# Altium footprint library Разъемы.PcbLib: 291 footprints (part 2 of 19)
Each footprint in its own frame and in the unit in brackets; x right, y up, seen from the top. Pads: shape width x height; smd on the part's side, far side on the other; paste and mask are expansions set on the pad; w line width, h text height; cw(c..) or ccw(c..) is an arc to the next point about the centre after c.
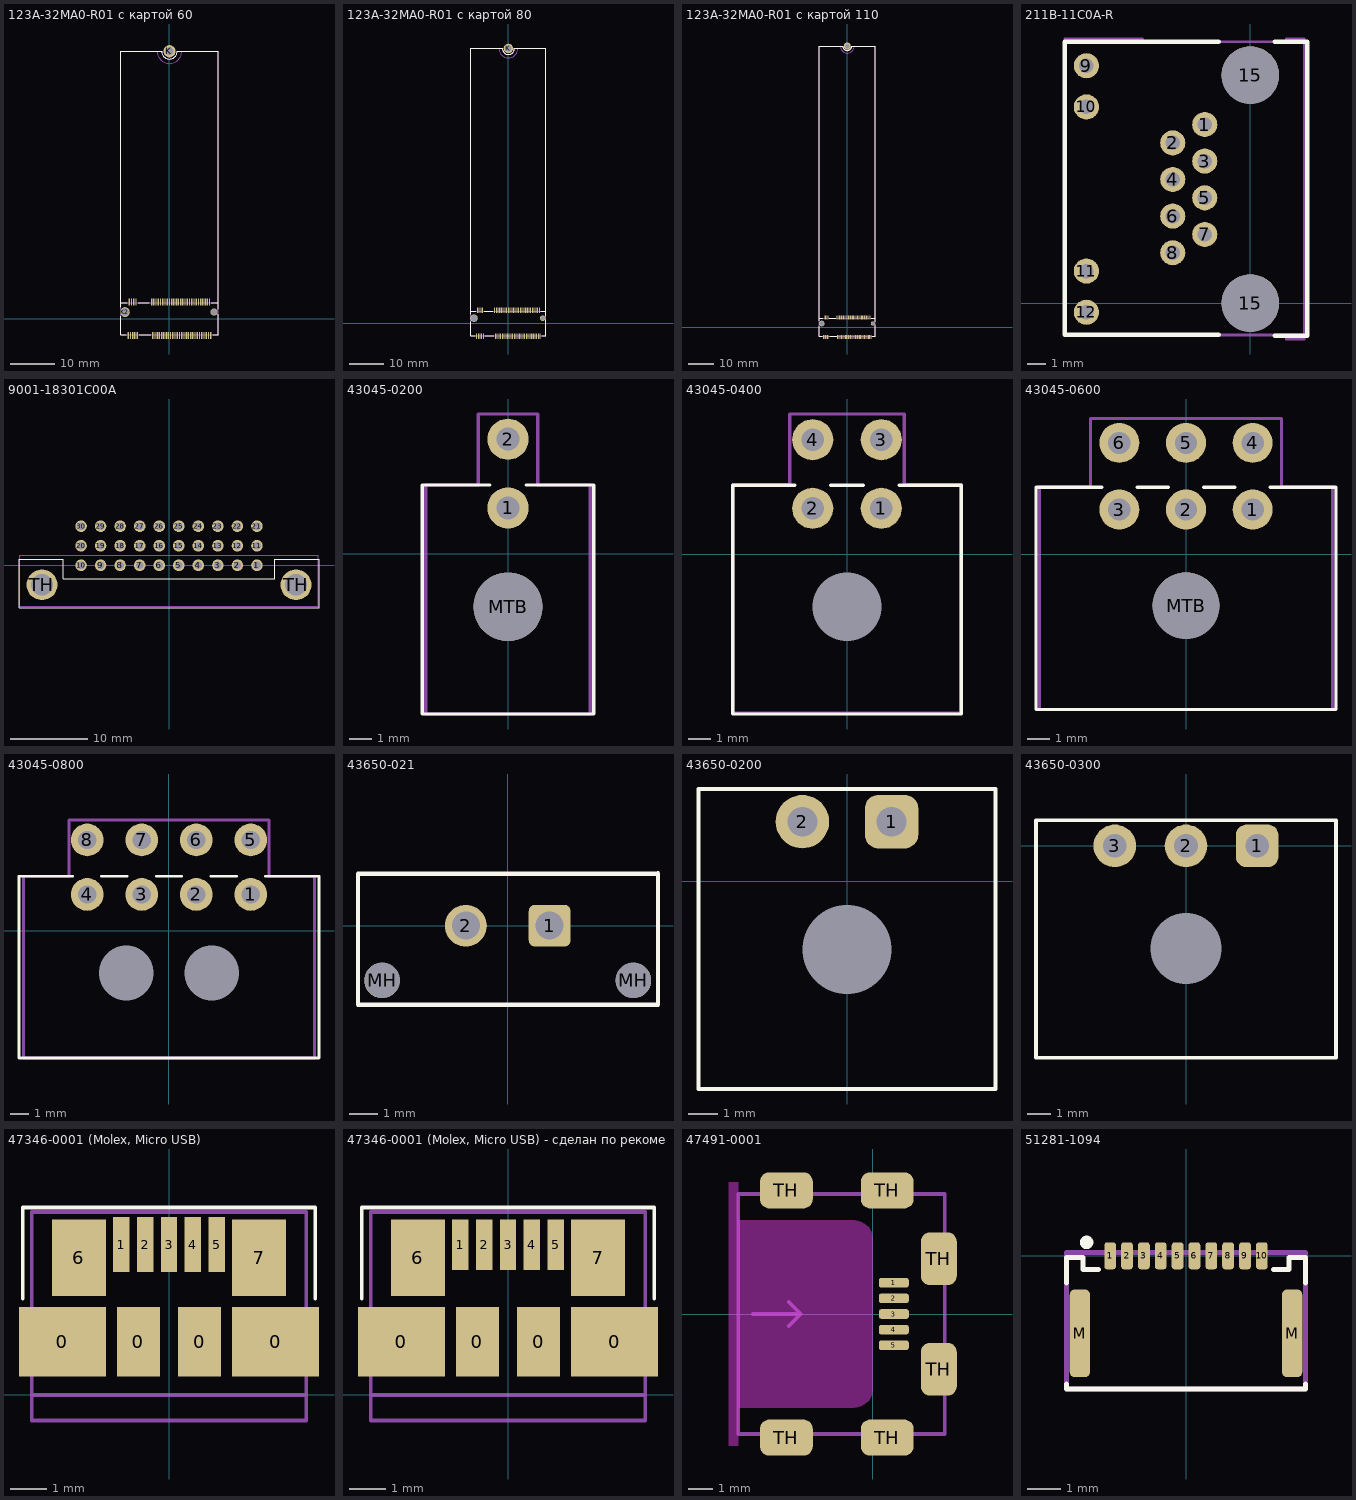
[diagram p1: the footprints below, top view; thin cyan lines are the x and y axes]

## 123A-32MA0-R01 с картой 60 [mm]
height 3
pads (67):
  rect 0.3x1.55 smd: 1(9.25,-3.775) 1(9.25,-3.775) 2(9,3.775) 3(8.75,-3.775) 4(8.5,3.775) 5(8.25,-3.775) 6(8,3.775) 7(7.75,-3.775) 8(7.5,3.775) 9(7.25,-3.775) 10(7,3.775) 11(6.75,-3.775) 12(6.5,3.775) 13(6.25,-3.775) 14(6,3.775) 15(5.75,-3.775) 16(5.5,3.775) 17(5.25,-3.775) 18(5,3.775) 19(4.75,-3.775) 20(4.5,3.775) 21(4.25,-3.775) 22(4,3.775) 23(3.75,-3.775) 24(3.5,3.775) 25(3.25,-3.775) 26(3,3.775) 27(2.75,-3.775) 28(2.5,3.775) 29(2.25,-3.775) 30(2,3.775) 31(1.75,-3.775) 32(1.5,3.775) 33(1.25,-3.775) 34(1,3.775) 35(0.75,-3.775) 36(0.5,3.775) 37(0.25,-3.775) 38(0,3.775) 39(-0.25,-3.775) 40(-0.5,3.775) 41(-0.75,-3.775) 42(-1,3.775) 43(-1.25,-3.775) 44(-1.5,3.775) 45(-1.75,-3.775) 46(-2,3.775) 47(-2.25,-3.775) 48(-2.5,3.775) 49(-2.75,-3.775) 50(-3,3.775) 51(-3.25,-3.775) 52(-3.5,3.775) 53(-3.75,-3.775) 54(-4,3.775) 67(-7.25,-3.775) 68(-7.5,3.775) 69(-7.75,-3.775) 70(-8,3.775) 71(-8.25,-3.775) 72(-8.5,3.775) 73(-8.75,-3.775) 74(-9,3.775) 75(-9.25,-3.775)
  round 2.75 hole 1.75: K(0,60)
  round 1.6 hole 1.3: K1(10,1.5)
  round 2.2 hole 1.8: K2(-10,1.5)
Top Overlay:
  lines w0.1: -10.9,0.5 -10.9,-3.55 -9.7,-3.55 ; -10.9,2.6 -10.9,3.55 ; -9.5,3.55 -10.9,3.55 ; -7,3.55 -4.5,3.55 ; -6.8,-3.55 -4.2,-3.55 ; 9.4,3.55 10.9,3.55 ; 9.7,-3.55 10.9,-3.55 10.9,1 ; 10.9,2.1 10.9,3.55 ; -10.9,3.55 -10.9,60 -1.75,60 ccw(c0,60) 1.75,60 10.9,60 10.9,3.55
Mechanical 1:
  lines w0.1: -2.75,60 ccw(c0,60) 2.75,60 ; -10.9,3.55 -10.9,60 -1.75,60 ccw(c0,60) 1.75,60 10.9,60 10.9,3.55 ; -10.9,3.55 -10.9,-3.55 10.9,-3.55 10.9,3.55 ; -10.9,3.55 10.9,3.55

## 123A-32MA0-R01 с картой 80 [mm]
height 3
pads (67):
  rect 0.3x1.55 smd: 1(9.25,-3.775) 1(9.25,-3.775) 2(9,3.775) 3(8.75,-3.775) 4(8.5,3.775) 5(8.25,-3.775) 6(8,3.775) 7(7.75,-3.775) 8(7.5,3.775) 9(7.25,-3.775) 10(7,3.775) 11(6.75,-3.775) 12(6.5,3.775) 13(6.25,-3.775) 14(6,3.775) 15(5.75,-3.775) 16(5.5,3.775) 17(5.25,-3.775) 18(5,3.775) 19(4.75,-3.775) 20(4.5,3.775) 21(4.25,-3.775) 22(4,3.775) 23(3.75,-3.775) 24(3.5,3.775) 25(3.25,-3.775) 26(3,3.775) 27(2.75,-3.775) 28(2.5,3.775) 29(2.25,-3.775) 30(2,3.775) 31(1.75,-3.775) 32(1.5,3.775) 33(1.25,-3.775) 34(1,3.775) 35(0.75,-3.775) 36(0.5,3.775) 37(0.25,-3.775) 38(0,3.775) 39(-0.25,-3.775) 40(-0.5,3.775) 41(-0.75,-3.775) 42(-1,3.775) 43(-1.25,-3.775) 44(-1.5,3.775) 45(-1.75,-3.775) 46(-2,3.775) 47(-2.25,-3.775) 48(-2.5,3.775) 49(-2.75,-3.775) 50(-3,3.775) 51(-3.25,-3.775) 52(-3.5,3.775) 53(-3.75,-3.775) 54(-4,3.775) 67(-7.25,-3.775) 68(-7.5,3.775) 69(-7.75,-3.775) 70(-8,3.775) 71(-8.25,-3.775) 72(-8.5,3.775) 73(-8.75,-3.775) 74(-9,3.775) 75(-9.25,-3.775)
  round 2.75 hole 1.75: K(0,80)
  round 1.6 hole 1.3: K1(10,1.5)
  round 2.2 hole 1.8: K2(-10,1.5)
Top Overlay:
  lines w0.1: -10.9,0.5 -10.9,-3.55 -9.7,-3.55 ; -10.9,2.6 -10.9,3.55 ; -9.5,3.55 -10.9,3.55 ; -7,3.55 -4.5,3.55 ; -6.8,-3.55 -4.2,-3.55 ; 9.4,3.55 10.9,3.55 ; 9.7,-3.55 10.9,-3.55 10.9,1 ; 10.9,2.1 10.9,3.55 ; -10.9,3.55 -10.9,80 -1.75,80 ccw(c0,80) 1.75,80 10.9,80 10.9,3.55
Mechanical 1:
  lines w0.1: -2.75,80 ccw(c0,80) 2.75,80 ; -10.9,3.55 10.9,3.55 ; -10.9,3.55 -10.9,-3.55 10.9,-3.55 10.9,3.55 ; -10.9,3.55 -10.9,80 -1.75,80 ccw(c0,80) 1.75,80 10.9,80 10.9,3.55

## 123A-32MA0-R01 с картой 110 [mm]
height 3
pads (67):
  rect 0.3x1.55 smd: 1(9.25,-3.775) 1(9.25,-3.775) 2(9,3.775) 3(8.75,-3.775) 4(8.5,3.775) 5(8.25,-3.775) 6(8,3.775) 7(7.75,-3.775) 8(7.5,3.775) 9(7.25,-3.775) 10(7,3.775) 11(6.75,-3.775) 12(6.5,3.775) 13(6.25,-3.775) 14(6,3.775) 15(5.75,-3.775) 16(5.5,3.775) 17(5.25,-3.775) 18(5,3.775) 19(4.75,-3.775) 20(4.5,3.775) 21(4.25,-3.775) 22(4,3.775) 23(3.75,-3.775) 24(3.5,3.775) 25(3.25,-3.775) 26(3,3.775) 27(2.75,-3.775) 28(2.5,3.775) 29(2.25,-3.775) 30(2,3.775) 31(1.75,-3.775) 32(1.5,3.775) 33(1.25,-3.775) 34(1,3.775) 35(0.75,-3.775) 36(0.5,3.775) 37(0.25,-3.775) 38(0,3.775) 39(-0.25,-3.775) 40(-0.5,3.775) 41(-0.75,-3.775) 42(-1,3.775) 43(-1.25,-3.775) 44(-1.5,3.775) 45(-1.75,-3.775) 46(-2,3.775) 47(-2.25,-3.775) 48(-2.5,3.775) 49(-2.75,-3.775) 50(-3,3.775) 51(-3.25,-3.775) 52(-3.5,3.775) 53(-3.75,-3.775) 54(-4,3.775) 67(-7.25,-3.775) 68(-7.5,3.775) 69(-7.75,-3.775) 70(-8,3.775) 71(-8.25,-3.775) 72(-8.5,3.775) 73(-8.75,-3.775) 74(-9,3.775) 75(-9.25,-3.775)
  round 2.75 hole 1.75: K(0,110)
  round 1.6 hole 1.3: K1(10,1.5)
  round 2.2 hole 1.8: K2(-10,1.5)
Top Overlay:
  lines w0.1: -10.9,0.5 -10.9,-3.55 -9.7,-3.55 ; -10.9,2.6 -10.9,3.55 ; -9.5,3.55 -10.9,3.55 ; -7,3.55 -4.5,3.55 ; -6.8,-3.55 -4.2,-3.55 ; 9.4,3.55 10.9,3.55 ; 9.7,-3.55 10.9,-3.55 10.9,1 ; 10.9,2.1 10.9,3.55 ; -10.9,3.55 -10.9,110 -1.75,110 ccw(c0,110) 1.75,110 10.9,110 10.9,3.55
Mechanical 1:
  lines w0.1: -2.75,110 ccw(c0,110) 2.75,110 ; -10.9,3.55 10.9,3.55 ; -10.9,3.55 -10.9,-3.55 10.9,-3.55 10.9,3.55 ; -10.9,3.55 -10.9,110 -1.75,110 ccw(c0,110) 1.75,110 10.9,110 10.9,3.55

## 211B-11C0A-R [mm]
pads (14):
  round 1.4 hole 0.8: 1(-2.54,9.94) 2(-4.32,8.92) 3(-2.54,7.9) 4(-4.32,6.88) 5(-2.54,5.86) 6(-4.32,4.84) 7(-2.54,3.82) 8(-4.32,2.8) 9(-9.13,13.21) 10(-9.13,10.92) 11(-9.13,1.78) 12(-9.13,-0.51)
  round 3.2 hole 3.2 unplated: 15(0,0) 15(0,12.69)
Top Overlay:
  lines w0.254: -1.75,-1.775 -10.325,-1.775 -10.325,14.55 -1.75,14.55 ; 1.35,-1.83 3.16,-1.83 3.16,14.55 1.35,14.55
Mechanical 29:
  lines w0.15: -6,-1.775 -10.325,-1.775 ; -6,14.7 -10.325,14.7 -10.325,-1.775 ; 2,-2 3,-2 3,14.7 2,14.7 ; -10.325,-1.775 3.06,-1.775 3.06,14.55 -10.325,14.55 -10.325,-1.775
3D body "AMPHENOL_RJHSE-5381.stp": height 15.14, standoff -3.7, extent -10.503,-2 5.7,14.83

## 9001-18301C00A [mm]
height 9
pads (32):
  round 1.5 hole 1: 1(11.43,0) 2(8.89,0) 3(6.35,0) 4(3.81,0) 5(1.27,0) 6(-1.27,0) 7(-3.81,0) 8(-6.35,0) 9(-8.89,0) 10(-11.43,0) 11(11.43,2.54) 12(8.89,2.54) 13(6.35,2.54) 14(3.81,2.54) 15(1.27,2.54) 16(-1.27,2.54) 17(-3.81,2.54) 18(-6.35,2.54) 19(-8.89,2.54) 20(-11.43,2.54) 21(11.43,5.08) 22(8.89,5.08) 23(6.35,5.08) 24(3.81,5.08) 25(1.27,5.08) 26(-1.27,5.08) 27(-3.81,5.08) 28(-6.35,5.08) 29(-8.89,5.08) 30(-11.43,5.08)
  round 4 hole 2.8: TH(-16.51,-2.54) TH(16.51,-2.54)
Top Overlay:
  lines w0.15: -19.5,-5.5 0.25,-5.5 19.5,-5.5 19.5,0.75 13.75,0.75 13.75,-1.75 0,-1.75 -13.75,-1.75 -13.75,0.75 -19.5,0.75 -19.5,-5.5
  text "." at 13,0 h0.1
Mechanical 29:
  lines w0.15: -19.4,-5.3 19.4,-5.3 19.4,1.3 -19.4,1.3 -19.4,-5.3
3D body "0925_DIN_Type_3C_angled_male_30_pole.stp": height 9.35, standoff -3, extent -19.35,-12.64 19.35,5.38

## 43045-0200 [mm] "Molex, Micro-Fit 3.0пїЅ Right Angle Header, 3.00mm Pitch, Dual Row, 2 Circuits, with Snap-in Plastic Peg PCB Lock, Tin, Glow Wire Capable, Black"
height 8.77
pads (3):
  round 1.8 hole 1: 1(0,2) 2(0,5)
  round 3 hole 3 unplated: MTB(0,-2.32)
Top Overlay:
  lines w0.15: -0.794,3 -3.75,3 -3.75,-7 3.75,-7 3.75,3 0.794,3
Top Courtyard:
  lines w0.15: -3.6,-7 -3.6,3 -1.3,3 -1.3,6.1 0,6.1 1.3,6.1 1.3,3 3.6,3 3.6,-7 0,-7 -3.6,-7
3D body "430450200.stp": height 8.77, standoff -3.18, extent -3.575,-6.92 3.575,5.32

## 43045-0400 [mm] "Molex, Micro-Fit 3.0пїЅ Right Angle Header, 3.00mm Pitch, Dual Row, 4 Circuits, with Snap-in Plastic Peg PCB Lock, Tin, Glow Wire Capable, Black"
height 8.77
pads (5):
  round 1.8 hole 1: 1(1.5,2) 2(-1.5,2) 3(1.5,5) 4(-1.5,5)
  round 0 hole 3 unplated: MTB(0,-2.3)
Top Overlay:
  lines w0.15: -2.294,3 -5,3 -5,-7 5,-7 5,3 2.294,3 ; -0.706,3 0.706,3
Top Courtyard:
  lines w0.15: -5,-6.975 -5,3.025 -2.5,3.025 -2.5,6.125 0,6.125 2.5,6.125 2.5,3.025 5,3.025 5,-6.975 0,-6.975 -5,-6.975
3D body "430450400.stp": height 8.77, standoff -3.18, extent -5.075,-6.92 5.075,5.32

## 43045-0600 [mm] "Molex, Micro-Fit 3.0пїЅ Right Angle Header, 3.00mm Pitch, Dual Row, 6 Circuits, with Snap-in Plastic Peg PCB Lock, Tin, Glow Wire Capable, Black"
height 8.77
pads (7):
  round 1.8 hole 1: 1(3,2) 2(0,2) 3(-3,2) 4(3,5) 5(0,5) 6(-3,5)
  round 3 hole 3 unplated: MTB(0,-2.325)
Top Overlay:
  lines w0.15: -3.794,3 -6.75,3 -6.75,-7 6.75,-7 6.75,3 3.794,3 ; -2.206,3 -0.794,3 ; 0.794,3 2.206,3
Top Courtyard:
  lines w0.15: -6.6,-7 0,-7 6.6,-7 6.6,3 4.3,3 4.3,6.1 0,6.1 -4.3,6.1 -4.3,3 -6.6,3 -6.6,-7
3D body "430450600.stp": height 8.77, standoff -3.18, extent -6.575,-6.92 6.575,5.32

## 43045-0800 [mm] "Molex, Micro-Fit 3.0пїЅ Right Angle Header, 3.00mm Pitch, Dual Row, 8 Circuits, with Snap-in Plastic Peg PCB Lock, Tin, Glow Wire Capable, Black"
height 8.77
pads (10):
  round 1.8 hole 1: 1(4.5,2) 2(1.5,2) 3(-1.5,2) 4(-4.5,2) 5(4.5,5) 6(1.5,5) 7(-1.5,5) 8(-4.5,5)
  round 0 hole 3 unplated: MTB(-2.34,-2.32) MTB(2.34,-2.32)
Top Overlay:
  lines w0.15: -5.294,3 -8.25,3 -8.25,-7 8.25,-7 8.25,3 5.294,3 ; -3.706,3 -2.294,3 ; -0.706,3 0.706,3 ; 2.294,3 3.706,3
Top Courtyard:
  lines w0.15: -8,-7 0,-7 8,-7 8,3 5.5,3 5.5,6.1 0,6.1 -5.5,6.1 -5.5,3 -8,3 -8,-7
3D body "430450800.stp": height 8.77, standoff -3.18, extent -8.075,-6.92 8.075,5.32

## 43650-021 [mm]
pads (4):
  rrect30% 1.5x1.5 hole 1: 1(1.5,0)
  round 1.5 hole 1: 2(-1.5,0)
  round 1.27 hole 1.27 unplated: MH(-4.5,-1.96) MH(4.5,-1.96)
Top Overlay:
  lines w0.15: 5.378,1.861 -5.36,1.861 -5.36,-2.83 5.378,-2.83 5.378,1.879
  text "." at 2,2.25 h0.1
3D body "436500215.stp": height 9.95, standoff -3.13, extent -4.825,-2.47 4.825,3.135

## 43650-0200 [mm]
pads (3):
  rrect50% 1.8x1.8 hole 1: 1(1.5,2)
  round 1.8 hole 1: 2(-1.5,2)
  round 0 hole 3 unplated: MTB(0,-2.3)
Top Overlay:
  lines w0.15: -5,-7 5,-7 5,3.1 -5,3.1 -5,-7
  text "." at 1.5,3.75 h0.1
3D body "436500200.stp": height 5.64, standoff -3.27, extent -4.825,-6.85 4.825,3.05

## 43650-0300 [mm]
pads (4):
  rrect50% 1.8x1.8 hole 1: 1(3,0)
  round 1.8 hole 1: 2(0,0) 3(-3,0)
  round 0 hole 3 unplated: MTB(0,-4.32)
Top Overlay:
  lines w0.15: -6.325,-8.934 -6.325,1.081 6.325,1.081 6.325,-8.934 -6.325,-8.934
  text "." at 3.25,1.75 h0.1
3D body "436500300.stp": height 5.64, standoff -3.27, extent -6.325,-8.95 6.325,0.95

## 47346-0001 (Molex, Micro USB) [mm] "47346-0001 (Molex, Micro USB)"
height 2.45
pads (11):
  rect 2.375x1.9 smd: 0(-2.913,1.45) 0(2.913,1.45)
  rect 1.175x1.9 smd: 0(-0.837,1.45) 0(0.837,1.45)
  rect 0.45x1.5 smd: 1(-1.3,4.11) 2(-0.65,4.11) 3(0,4.11) 4(0.65,4.11) 5(1.3,4.11)
  rect 1.475x2.1 smd: 6(-2.462,3.75) 7(2.462,3.75)
Top Overlay:
  lines w0.1: -4,2.625 -4,5.125 4,5.125 4,2.625
Mechanical 1:
  lines w0.1: -3.75,0 -3.75,5 3.75,5 3.75,0 ; -3.75,0 3.75,0 ; -3.75,0 -3.75,-0.7 3.75,-0.7 3.75,0
3D body "47346-0001 (Molex, micro USB).stp": height 2.7, standoff -0.24, extent -3.99,-0.65 3.99,4.78

## 47346-0001 (Molex, Micro USB) - сделан по рекомендации Molex [mm] "47346-0001 (Molex, Micro USB)"
height 2.45
pads (11):
  rect 2.375x1.9 smd: 0(-2.913,1.45) 0(2.913,1.45)
  rect 1.175x1.9 smd: 0(-0.837,1.45) 0(0.837,1.45)
  rect 0.45x1.38 smd: 1(-1.3,4.11) 2(-0.65,4.11) 3(0,4.11) 4(0.65,4.11) 5(1.3,4.11)
  rect 1.475x2.1 smd: 6(-2.462,3.75) 7(2.462,3.75)
Top Overlay:
  lines w0.1: -4,2.625 -4,5.125 4,5.125 4,2.625
Mechanical 1:
  lines w0.1: -3.75,0 -3.75,-0.7 3.75,-0.7 3.75,0 ; -3.75,0 3.75,0 ; -3.75,0 -3.75,5 3.75,5 3.75,0
3D body "47346-0001 (Molex, micro USB).stp": height 2.7, standoff -0.24, extent -3.99,-0.65 3.99,4.78

## 47491-0001 [mm]
pads (11):
  rrect50% 1.25x0.4 smd: 1(0.875,1.3) 2(0.875,0.65) 3(0.875,0) 4(0.875,-0.65) 5(0.875,-1.3)
  rrect50% 2.2x1.5 smd: TH(-3.6,-5.15) TH(-3.6,5.15) TH(0.6,-5.15) TH(0.6,5.15)
  rrect50% 1.5x2.2 smd: TH(2.75,-2.3) TH(2.75,2.3)
Keep-Out Layer:
  board cut-out: -6,-5.5 -6,5.5 -5.6,5.5 -5.6,3.9 -0.8,3.9 -0.721,3.9 -0.567,3.869 -0.421,3.809 -0.29,3.721 -0.179,3.61 -0.091,3.479 -0.031,3.333 0,3.179 0,3.1 0,-3.1 0,-3.179 -0.031,-3.333 -0.091,-3.479 -0.179,-3.61 -0.29,-3.721 -0.421,-3.809 -0.567,-3.869 -0.721,-3.9 -0.8,-3.9 -5.6,-3.9 -5.6,-5.5
Mechanical 29:
  lines w0.15: -5,0 -3,0 ; -3.5,-0.5 -3,0 ; -3.5,0.5 -3,0 ; -5.6,-5 3,-5 3,5 -5.6,5 -5.6,-5
3D body "474910001.stp": height 1.47, standoff -1.47, extent -5.905,-5.5 3.225,5.5

## 51281-1094 [mm]
pads (12):
  rrect50% 0.35x0.8 smd: 1(-2.25,0) 2(-1.75,0) 3(-1.25,0) 4(-0.75,0) 5(-0.25,0) 6(0.25,0) 7(0.75,0) 8(1.25,0) 9(1.75,0) 10(2.25,0)
  rrect50% 0.6x2.6 smd: M(-3.15,-2.3) M(3.15,-2.3)
Top Overlay:
  circle w0.2: c-2.95,0.4 r0.1
  lines w0.15: -3.55,-3.8 -3.55,-3.95 3.55,-3.95 3.55,-3.8 ; -3.55,-0.8 -3.55,-0.05 -3.05,-0.05 -3.05,-0.4 -2.9,-0.4 -2.6,-0.4 ; 2.6,-0.4 2.9,-0.4 3.05,-0.4 3.05,-0.05 3.55,-0.05 3.55,-0.8
Top Courtyard:
  lines w0.15: -3.55,-3.95 -3.55,0.1 3.55,0.1 3.55,-3.95 -3.55,-3.95
3D body "512811094.stp": height 1.2, standoff 0, extent -3.55,-3.95 3.55,0.1